# Altium footprint library DipComponent.PcbLib: 303 footprints (part 14 of 19)
Each footprint in its own frame and in the unit in brackets; x right, y up, seen from the top. Pads: shape width x height; smd on the part's side, far side on the other; paste and mask are expansions set on the pad; w line width, h text height; cw(c..) or ccw(c..) is an arc to the next point about the centre after c.
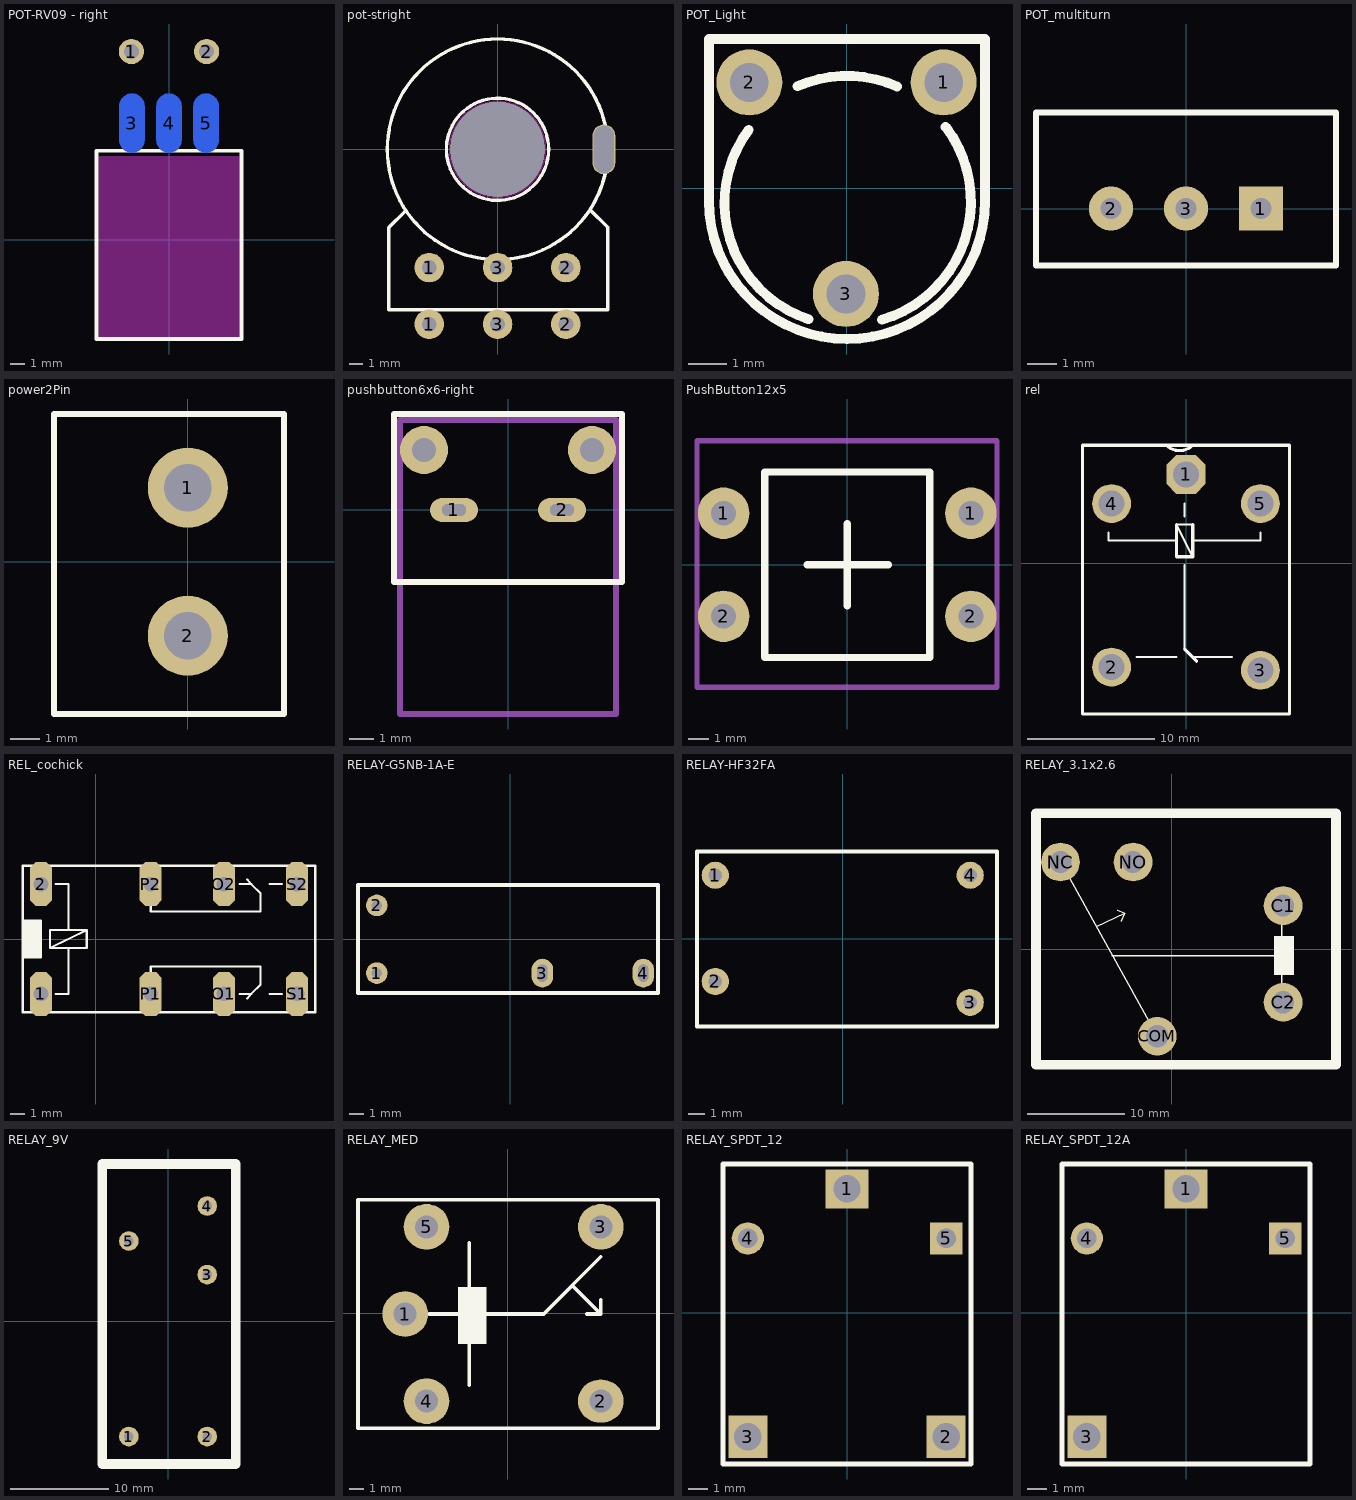
[diagram p13: the footprints below, top view; thin cyan lines are the x and y axes]

## POT-RV09 - right [mm]
pads (5):
  round 1.7 hole 1: 1(-2.54,12.7) 2(2.54,12.7)
  oval 1.7x4 smd far side: 3(-2.5,7.875) 4(0,7.875) 5(2.5,7.875)
Top Overlay:
  lines w0.254: -4.9,-6.7 4.9,-6.7 4.9,6 -4.9,6 -4.9,-6.7
Keep-Out Layer:
  board cut-out: -4.75,-6.6 4.75,-6.6 4.75,5.625 -4.75,5.625
3D body "Potentiometerquad-09-1.STEP": height 6.7, standoff -20.6, extent -4.73,-5.367 4.775,9.483

## pot-stright [mm]
pads (7):
  round 2.2 hole 1.1: 1(-5.08,-13) 1(-5.08,-8.79) 2(5.08,-13) 2(5.08,-8.79) 3(0,-13) 3(0,-8.79)
  oval 1.7x3.7 hole 1.5 slot 3.5 at 90 deg: ""(7.9,0)
via 0,0 diameter 7 hole 7
Top Overlay:
  circle w0.254: c0,0 r8.2
  circle w0.254: c0,0 r3.8
  lines w0.254: -6.833,-4.593 -6.858,-4.593 -8.077,-5.812 -8.077,-11.933 8.179,-11.933 8.179,-5.786 6.871,-4.478
Keep-Out Layer:
  circle w0.254: c0,0 r3.5
3D body "Potentiometer-3.step": height 9, standoff -19.7, extent -8.424,-16.72 8.576,8.264
3D body "header-5.08-3w .stp": height 15.12, standoff -3.93, extent -7.495,-11.965 7.495,-5.615

## POT_Light [mm]
pads (3):
  round 1.7 hole 1: 1(2.502,2.722) 2(-2.502,2.722)
  round 1.7 hole 1 paste+0: 3(-0.014,-2.722)
Top Overlay:
  lines w0.254: -2.516,1.505 ccw(c0.014,-0.379) -0.978,-3.374 ; -1.269,2.623 cw(c0.013,-0.326) 1.304,2.619 ; 0.91,-3.385 ccw(c0.036,-0.341) 2.553,1.579 ; -3.543,-0.326 ccw(c0.013,-0.326) 3.569,-0.326 3.569,3.23 3.569,3.84 -3.543,3.84 -3.543,3.23 -3.543,-0.326
3D body "User Library-Trimmer, 3306F-1.STEP": height 7.62, standoff -3.04, extent -3.354,-3.35 3.456,4.902

## POT_multiturn [mm]
pads (3):
  rect 1.5x1.5 hole 0.7: 1(2.54,0)
  round 1.5 hole 0.7: 2(-2.54,0) 3(0,0)
Top Overlay:
  lines w0.2: -5.08,-1.93 -5.08,0 -5.08,3.251 5.08,3.251 5.08,-1.93 -5.08,-1.93
3D body "User Library-multi turn.step": height 12.57, standoff -2.16, extent -5.08,-1.93 5.08,3.15

## power2Pin [mm]
pads (2):
  round 2.7 hole 1.6: 1(0,2.5) 2(0,-2.5)
Top Overlay:
  lines w0.2: -4.521,-5.145 3.251,-5.145 3.251,4.989 -4.521,4.989 -4.521,-5.145
3D body "2-pin terminal block 5_0mm.step": height 10, standoff -3.5, extent -4.377,-5.685 3.073,4.995

## pushbutton6x6-right [mm]
pads (4):
  oval 2x1 hole 0.5 slot 1 at 0 deg: 1(-2.25,0) 2(2.25,0)
  round 2 hole 1 unplated: ""(-3.5,2.5) ""(3.5,2.5)
Top Overlay:
  lines w0.254: -4.75,-3 -4.75,4 4.75,4 4.75,-3 -4.75,-3
Mechanical 15:
  lines w0.254: -4.5,-8.5 4.5,-8.5 4.5,3.75 -4.5,3.75 -4.5,-8.5
3D body "pushbtn-6x6right.stp": height 7, standoff -3.52, extent -4.168,-8.356 4.24,4.001

## PushButton12x5 [mm]
pads (4):
  round 2.5 hole 1.2: 1(-6,2.5) 1(6,2.5) 2(-6,-2.5) 2(6,-2.5)
Top Overlay:
  lines w0.349: -1.956,0 2,0 ; 0,-2 0,2 ; -4,-4.5 -4,4.5 2,4.5 4,4.5 4,-4.5 -4,-4.5
Mechanical 15:
  lines w0.254: -7.29,-5.944 7.264,-5.944 7.264,6.02 6.909,6.02 -7.061,6.02 -7.29,6.02 -7.29,-5.944
3D body: height 7, standoff -10, extent -6,2.5 -6,2.5
3D body "User Library-tact switch 12x12x8mm.step": height 8.5, standoff -3.5, extent -6.96,-6 6.909,6

## rel [mil]
pads (5):
  oct 120x120 hole 80: 1(-0.5,274.5)
  round 120 hole 80: 2(-230.5,-320.5) 3(229.5,-330.5) 4(-230.5,184.5) 5(229.5,184.5)
Top Overlay:
  lines w6: -240,95.09 -240,70.09 -30,70.09 ; -153,-289.91 -30,-289.91 ; -5,-264.91 -5,-4.91 ; -5,145.09 -5,185.09 ; 20,-289.91 142,-289.91 ; 20,20.09 -30,120.09 20,120.09 ; 20,70.09 230,70.09 230,95.09
  lines w10: -60.5,364.5 ccw(c-20.5,404.5) 19.5,364.5 ; -30,120.09 -30,70.09 -30,20.09 20,20.09 20,70.09 20,120.09 ; -5,-264.91 20,-289.91 32,-302.91 ; -320.5,-465.5 -320.5,364.5 319.5,364.5 319.5,-465.5 -320.5,-465.5

## REL_cochick [mil]
pads (8):
  oct 60x120 hole 40: 1(-150,-150) 2(-150,150) O1(350,-150) O2(350,150) P1(150,-150) P2(150,150) S1(550,-150) S2(550,150)
Top Overlay:
  rectangle: -200,-50 -150,50
  lines w6: -110,-150 -75,-150 -75,-25 ; -110,150 -75,150 -75,25 ; 150,-110 150,-75 450,-75 450,-125 425,-150 ; 150,110 150,75 450,75 450,125 425,150 ; 393,-150 425,-150 ; 393,150 425,150 ; 413,-163 425,-150 ; 413,163 425,150 ; 475,-150 508,-150 ; 475,150 508,150 ; -200,-50 -200,-200 600,-200 600,200 -200,200 -200,50 ; -200,-50 -150,-50 -150,50 -200,50 ; -200,-50 -200,50 ; -125,-25 -25,25 ; -125,-25 -75,-25 ; -125,-25 -125,25 -75,25 ; -75,-25 -25,-25 -25,25 ; -75,25 -25,25
3D body "relay.step": height 452.76, standoff -118.11, extent -205,-202.63 602.09,195

## RELAY-G5NB-1A-E [mm]
pads (4):
  round 1.5 hole 0.7: 1(-9.25,-2.35) 2(-9.25,2.35)
  oval 1.5x2 hole 0.7 slot 1.2 at 90 deg: 3(2.25,-2.35) 4(9.25,-2.35)
Top Overlay:
  lines w0.254: -10.554,-3.729 -10.554,3.764 10.274,3.764 10.274,-3.729 -10.554,-3.729
3D body "RELAY-G5NB-1A-E.step": height 15.66, standoff -3.05, extent -10.381,-3.581 10.119,3.619

## RELAY-HF32FA [mil]
pads (4):
  round 64 hole 32: 1(-300,149.61) 2(-300,-100.39) 3(300,-149.61) 4(300,149.61)
Top Overlay:
  lines w10: -343,-206.39 363,-206.39 363,205.61 -343,205.61 -343,-206.39
3D body "hf32fa.stp": height 503.94, standoff -137.8, extent -336.77,-199.21 356.14,198.43

## RELAY_3.1x2.6 [mm]
pads (5):
  round 4 hole 2.3: C1(11.5,4.5) C2(11.5,-5.5) COM(-1.5,-9) NC(-11.5,9) NO(-4,9)
Top Overlay:
  rectangle: 10.562,-2.684 12.604,1.336
  lines w0.15: -11.645,9.301 -1.5,-9 ; -7.798,2.305 -4.883,3.704 ; -6.186,-0.674 11.47,-0.674 ; -5.641,3.996 -4.883,3.704 ; 11.382,-5.682 11.382,4.5 11.5,4.5 ; -4.883,3.704 -5.232,2.888 -4.883,3.704
  lines w1: -14.031,-11.954 16.969,-11.954 16.969,14.046 -14.031,14.046 -14.031,-11.954
3D body: height 28, standoff 0.3, extent -13.438,-11.384 16.534,13.508

## RELAY_9V [mm]
pads (5):
  round 2 hole 1: 1(-4,-11.757) 2(3.999,-11.757) 3(4,4.758) 4(4,11.758) 5(-4,8.187)
Top Overlay:
  lines w1: -6.7,-14.558 6.9,-14.558 6.9,16.043 -6.7,16.043 -6.7,-14.558
3D body: height 20, standoff 0, extent -6.2,-14.1 6.4,15.5

## RELAY_MED [mm]
pads (5):
  round 3.2 hole 1.6: 1(-7.189,-0.041) 3(6.511,6.059) 4(-5.689,-6.141) 5(-5.689,6.059)
  oval 3.2x3 hole 1.6: 2(6.511,-6.141)
Top Overlay:
  region: -1.489,1.859 -3.489,1.859 -3.489,-2.141 -1.489,-2.141
  lines w0.254: -5.489,-0.041 2.511,-0.041 6.511,3.959 ; -2.689,-5.041 -2.689,4.959 ; 4.511,1.959 6.511,-0.041 ; 5.511,-0.041 6.511,-0.041 ; 6.511,0.959 6.511,-0.041 ; 6.511,3.959 6.511,3.959 ; -10.489,-8.041 -10.489,7.959 10.511,7.959 10.511,-8.041 -10.489,-8.041
3D body "User Library-SONGLE Relay SRU-12VDC-SL-C.STEP": height 15.3, standoff -5, extent -9,-7.5 10.1,8

## RELAY_SPDT_12 [mm]
pads (5):
  rect 2.2x2 hole 1.4: 1(0,6.35)
  rect 2x2.2 hole 1.4: 2(5.08,-6.35) 3(-5.08,-6.35)
  round 1.65 hole 1: 4(-5.08,3.81)
  rect 1.65x1.65 hole 1: 5(5.08,3.81)
Top Overlay:
  lines w0.254: -6.35,-7.747 -6.35,7.62 6.35,7.62 6.35,-7.747 -6.35,-7.747
3D body: height 2.08, standoff -3, extent 4.839,3.391 5.321,4.229
3D body: height 2.08, standoff -3, extent -5.321,3.391 -4.839,4.229
3D body: height 2.08, standoff -3, extent 4.445,-6.604 5.715,-6.071
3D body: height 2.08, standoff -3, extent -5.715,-6.604 -4.445,-6.071
3D body: height 2.08, standoff -3, extent -0.635,6.071 0.635,6.604
3D body: height 12.7, standoff 0, extent -6.324,-7.696 6.325,7.569

## RELAY_SPDT_12A [mm]
pads (4):
  rect 2.2x2 hole 1.4: 1(0,6.35)
  rect 2x2.2 hole 1.4: 3(-5.08,-6.35)
  round 1.65 hole 1: 4(-5.08,3.81)
  rect 1.65x1.65 hole 1: 5(5.08,3.81)
Top Overlay:
  lines w0.254: -6.35,-7.747 6.35,-7.747 6.35,7.62 -6.35,7.62 -6.35,-7.747
3D body: height 12.7, standoff 0, extent -6.324,-7.696 6.325,7.569
3D body: height 2.08, standoff -3, extent -0.635,6.071 0.635,6.604
3D body: height 2.08, standoff -3, extent -5.715,-6.604 -4.445,-6.071
3D body: height 2.08, standoff -3, extent -5.321,3.391 -4.839,4.229
3D body: height 2.08, standoff -3, extent 4.839,3.391 5.321,4.229